# Altium footprint library JL_PCB.PCBLIB: 1129 footprints (part 44 of 72)
Each footprint in its own frame and in the unit in brackets; x right, y up, seen from the top. Pads: shape width x height; smd on the part's side, far side on the other; paste and mask are expansions set on the pad; w line width, h text height; cw(c..) or ccw(c..) is an arc to the next point about the centre after c.
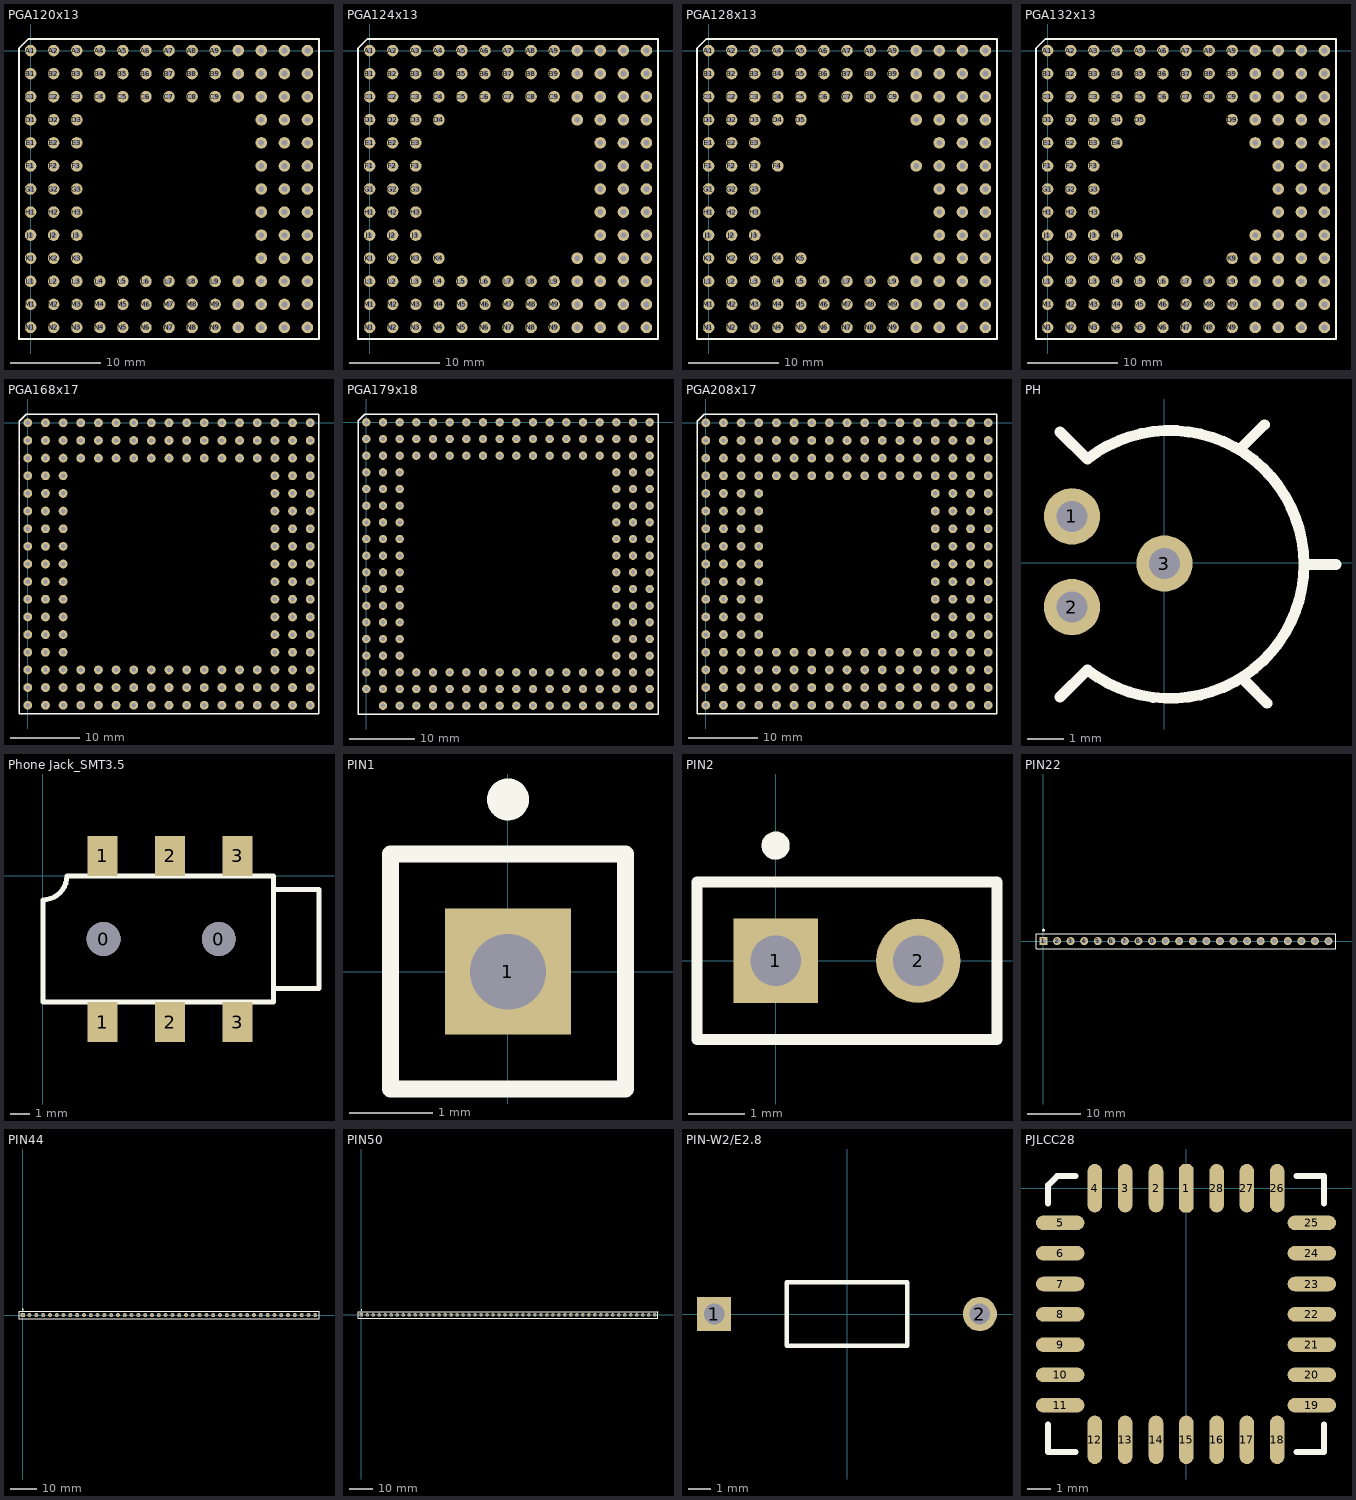
[diagram p43: the footprints below, top view; thin cyan lines are the x and y axes]

## PGA120x13 [mil]
pads (120):
  round 50 hole 25: A1(0,0) A2(100,0) A3(200,0) A4(300,0) A5(400,0) A6(500,0) A7(600,0) A8(700,0) A9(800,0) A10(900,0) A11(1000,0) A12(1100,0) A13(1200,0) B1(0,-100) B2(100,-100) B3(200,-100) B4(300,-100) B5(400,-100) B6(500,-100) B7(600,-100) B8(700,-100) B9(800,-100) B10(900,-100) B11(1000,-100) B12(1100,-100) B13(1200,-100) C1(0,-200) C2(100,-200) C3(200,-200) C4(300,-200) C5(400,-200) C6(500,-200) C7(600,-200) C8(700,-200) C9(800,-200) C10(900,-200) C11(1000,-200) C12(1100,-200) C13(1200,-200) D1(0,-300) D2(100,-300) D3(200,-300) D11(1000,-300) D12(1100,-300) D13(1200,-300) E1(0,-400) E2(100,-400) E3(200,-400) E11(1000,-400) E12(1100,-400) E13(1200,-400) F1(0,-500) F2(100,-500) F3(200,-500) F11(1000,-500) F12(1100,-500) F13(1200,-500) G1(0,-600) G2(100,-600) G3(200,-600) G11(1000,-600) G12(1100,-600) G13(1200,-600) H1(0,-700) H2(100,-700) H3(200,-700) H11(1000,-700) H12(1100,-700) H13(1200,-700) J1(0,-800) J2(100,-800) J3(200,-800) J11(1000,-800) J12(1100,-800) J13(1200,-800) K1(0,-900) K2(100,-900) K3(200,-900) K11(1000,-900) K12(1100,-900) K13(1200,-900) L1(0,-1000) L2(100,-1000) L3(200,-1000) L4(300,-1000) L5(400,-1000) L6(500,-1000) L7(600,-1000) L8(700,-1000) L9(800,-1000) L10(900,-1000) L11(1000,-1000) L12(1100,-1000) L13(1200,-1000) M1(0,-1100) M2(100,-1100) M3(200,-1100) M4(300,-1100) M5(400,-1100) M6(500,-1100) M7(600,-1100) M8(700,-1100) M9(800,-1100) M10(900,-1100) M11(1000,-1100) M12(1100,-1100) M13(1200,-1100) N1(0,-1200) N2(100,-1200) N3(200,-1200) N4(300,-1200) N5(400,-1200) N6(500,-1200) N7(600,-1200) N8(700,-1200) N9(800,-1200) N10(900,-1200) N11(1000,-1200) N12(1100,-1200) N13(1200,-1200)
TopOverlay:
  lines w8: -50,-1250 -50,10 -10,50 1250,50 1250,-1250 -50,-1250

## PGA124x13 [mil]
pads (124):
  round 50 hole 25: A1(0,0) A2(100,0) A3(200,0) A4(300,0) A5(400,0) A6(500,0) A7(600,0) A8(700,0) A9(800,0) A10(900,0) A11(1000,0) A12(1100,0) A13(1200,0) B1(0,-100) B2(100,-100) B3(200,-100) B4(300,-100) B5(400,-100) B6(500,-100) B7(600,-100) B8(700,-100) B9(800,-100) B10(900,-100) B11(1000,-100) B12(1100,-100) B13(1200,-100) C1(0,-200) C2(100,-200) C3(200,-200) C4(300,-200) C5(400,-200) C6(500,-200) C7(600,-200) C8(700,-200) C9(800,-200) C10(900,-200) C11(1000,-200) C12(1100,-200) C13(1200,-200) D1(0,-300) D2(100,-300) D3(200,-300) D4(300,-300) D10(900,-300) D11(1000,-300) D12(1100,-300) D13(1200,-300) E1(0,-400) E2(100,-400) E3(200,-400) E11(1000,-400) E12(1100,-400) E13(1200,-400) F1(0,-500) F2(100,-500) F3(200,-500) F11(1000,-500) F12(1100,-500) F13(1200,-500) G1(0,-600) G2(100,-600) G3(200,-600) G11(1000,-600) G12(1100,-600) G13(1200,-600) H1(0,-700) H2(100,-700) H3(200,-700) H11(1000,-700) H12(1100,-700) H13(1200,-700) J1(0,-800) J2(100,-800) J3(200,-800) J11(1000,-800) J12(1100,-800) J13(1200,-800) K1(0,-900) K2(100,-900) K3(200,-900) K4(300,-900) K10(900,-900) K11(1000,-900) K12(1100,-900) K13(1200,-900) L1(0,-1000) L2(100,-1000) L3(200,-1000) L4(300,-1000) L5(400,-1000) L6(500,-1000) L7(600,-1000) L8(700,-1000) L9(800,-1000) L10(900,-1000) L11(1000,-1000) L12(1100,-1000) L13(1200,-1000) M1(0,-1100) M2(100,-1100) M3(200,-1100) M4(300,-1100) M5(400,-1100) M6(500,-1100) M7(600,-1100) M8(700,-1100) M9(800,-1100) M10(900,-1100) M11(1000,-1100) M12(1100,-1100) M13(1200,-1100) N1(0,-1200) N2(100,-1200) N3(200,-1200) N4(300,-1200) N5(400,-1200) N6(500,-1200) N7(600,-1200) N8(700,-1200) N9(800,-1200) N10(900,-1200) N11(1000,-1200) N12(1100,-1200) N13(1200,-1200)
TopOverlay:
  lines w8: -50,-1250 -50,10 -10,50 1250,50 1250,-1250 -50,-1250

## PGA128x13 [mil]
pads (128):
  round 50 hole 25: A1(0,0) A2(100,0) A3(200,0) A4(300,0) A5(400,0) A6(500,0) A7(600,0) A8(700,0) A9(800,0) A10(900,0) A11(1000,0) A12(1100,0) A13(1200,0) B1(0,-100) B2(100,-100) B3(200,-100) B4(300,-100) B5(400,-100) B6(500,-100) B7(600,-100) B8(700,-100) B9(800,-100) B10(900,-100) B11(1000,-100) B12(1100,-100) B13(1200,-100) C1(0,-200) C2(100,-200) C3(200,-200) C4(300,-200) C5(400,-200) C6(500,-200) C7(600,-200) C8(700,-200) C9(800,-200) C10(900,-200) C11(1000,-200) C12(1100,-200) C13(1200,-200) D1(0,-300) D2(100,-300) D3(200,-300) D4(300,-300) D5(400,-300) D10(900,-300) D11(1000,-300) D12(1100,-300) D13(1200,-300) E1(0,-400) E2(100,-400) E3(200,-400) E11(1000,-400) E12(1100,-400) E13(1200,-400) F1(0,-500) F2(100,-500) F3(200,-500) F4(300,-500) F10(900,-500) F11(1000,-500) F12(1100,-500) F13(1200,-500) G1(0,-600) G2(100,-600) G3(200,-600) G11(1000,-600) G12(1100,-600) G13(1200,-600) H1(0,-700) H2(100,-700) H3(200,-700) H11(1000,-700) H12(1100,-700) H13(1200,-700) J1(0,-800) J2(100,-800) J3(200,-800) J11(1000,-800) J12(1100,-800) J13(1200,-800) K1(0,-900) K2(100,-900) K3(200,-900) K4(300,-900) K5(400,-900) K10(900,-900) K11(1000,-900) K12(1100,-900) K13(1200,-900) L1(0,-1000) L2(100,-1000) L3(200,-1000) L4(300,-1000) L5(400,-1000) L6(500,-1000) L7(600,-1000) L8(700,-1000) L9(800,-1000) L10(900,-1000) L11(1000,-1000) L12(1100,-1000) L13(1200,-1000) M1(0,-1100) M2(100,-1100) M3(200,-1100) M4(300,-1100) M5(400,-1100) M6(500,-1100) M7(600,-1100) M8(700,-1100) M9(800,-1100) M10(900,-1100) M11(1000,-1100) M12(1100,-1100) M13(1200,-1100) N1(0,-1200) N2(100,-1200) N3(200,-1200) N4(300,-1200) N5(400,-1200) N6(500,-1200) N7(600,-1200) N8(700,-1200) N9(800,-1200) N10(900,-1200) N11(1000,-1200) N12(1100,-1200) N13(1200,-1200)
TopOverlay:
  lines w8: -50,-1250 -50,10 -10,50 1250,50 1250,-1250 -50,-1250

## PGA132x13 [mil]
pads (132):
  round 50 hole 25: A1(0,0) A2(100,0) A3(200,0) A4(300,0) A5(400,0) A6(500,0) A7(600,0) A8(700,0) A9(800,0) A10(900,0) A11(1000,0) A12(1100,0) A13(1200,0) B1(0,-100) B2(100,-100) B3(200,-100) B4(300,-100) B5(400,-100) B6(500,-100) B7(600,-100) B8(700,-100) B9(800,-100) B10(900,-100) B11(1000,-100) B12(1100,-100) B13(1200,-100) C1(0,-200) C2(100,-200) C3(200,-200) C4(300,-200) C5(400,-200) C6(500,-200) C7(600,-200) C8(700,-200) C9(800,-200) C10(900,-200) C11(1000,-200) C12(1100,-200) C13(1200,-200) D1(0,-300) D2(100,-300) D3(200,-300) D4(300,-300) D5(400,-300) D9(800,-300) D10(900,-300) D11(1000,-300) D12(1100,-300) D13(1200,-300) E1(0,-400) E2(100,-400) E3(200,-400) E4(300,-400) E10(900,-400) E11(1000,-400) E12(1100,-400) E13(1200,-400) F1(0,-500) F2(100,-500) F3(200,-500) F11(1000,-500) F12(1100,-500) F13(1200,-500) G1(0,-600) G2(100,-600) G3(200,-600) G11(1000,-600) G12(1100,-600) G13(1200,-600) H1(0,-700) H2(100,-700) H3(200,-700) H11(1000,-700) H12(1100,-700) H13(1200,-700) J1(0,-800) J2(100,-800) J3(200,-800) J4(300,-800) J10(900,-800) J11(1000,-800) J12(1100,-800) J13(1200,-800) K1(0,-900) K2(100,-900) K3(200,-900) K4(300,-900) K5(400,-900) K9(800,-900) K10(900,-900) K11(1000,-900) K12(1100,-900) K13(1200,-900) L1(0,-1000) L2(100,-1000) L3(200,-1000) L4(300,-1000) L5(400,-1000) L6(500,-1000) L7(600,-1000) L8(700,-1000) L9(800,-1000) L10(900,-1000) L11(1000,-1000) L12(1100,-1000) L13(1200,-1000) M1(0,-1100) M2(100,-1100) M3(200,-1100) M4(300,-1100) M5(400,-1100) M6(500,-1100) M7(600,-1100) M8(700,-1100) M9(800,-1100) M10(900,-1100) M11(1000,-1100) M12(1100,-1100) M13(1200,-1100) N1(0,-1200) N2(100,-1200) N3(200,-1200) N4(300,-1200) N5(400,-1200) N6(500,-1200) N7(600,-1200) N8(700,-1200) N9(800,-1200) N10(900,-1200) N11(1000,-1200) N12(1100,-1200) N13(1200,-1200)
TopOverlay:
  lines w8: -50,-1250 -50,10 -10,50 1250,50 1250,-1250 -50,-1250

## PGA168x17 [mil]
pads (168):
  round 50 hole 25: A1(0,0) A2(100,0) A3(200,0) A4(300,0) A5(400,0) A6(500,0) A7(600,0) A8(700,0) A9(800,0) A10(900,0) A11(1000,0) A12(1100,0) A13(1200,0) A14(1300,0) A15(1400,0) A16(1500,0) A17(1600,0) B1(0,-100) B2(100,-100) B3(200,-100) B4(300,-100) B5(400,-100) B6(500,-100) B7(600,-100) B8(700,-100) B9(800,-100) B10(900,-100) B11(1000,-100) B12(1100,-100) B13(1200,-100) B14(1300,-100) B15(1400,-100) B16(1500,-100) B17(1600,-100) C1(0,-200) C2(100,-200) C3(200,-200) C4(300,-200) C5(400,-200) C6(500,-200) C7(600,-200) C8(700,-200) C9(800,-200) C10(900,-200) C11(1000,-200) C12(1100,-200) C13(1200,-200) C14(1300,-200) C15(1400,-200) C16(1500,-200) C17(1600,-200) D1(0,-300) D2(100,-300) D3(200,-300) D15(1400,-300) D16(1500,-300) D17(1600,-300) E1(0,-400) E2(100,-400) E3(200,-400) E15(1400,-400) E16(1500,-400) E17(1600,-400) F1(0,-500) F2(100,-500) F3(200,-500) F15(1400,-500) F16(1500,-500) F17(1600,-500) G1(0,-600) G2(100,-600) G3(200,-600) G15(1400,-600) G16(1500,-600) G17(1600,-600) H1(0,-700) H2(100,-700) H3(200,-700) H15(1400,-700) H16(1500,-700) H17(1600,-700) J1(0,-800) J2(100,-800) J3(200,-800) J15(1400,-800) J16(1500,-800) J17(1600,-800) K1(0,-900) K2(100,-900) K3(200,-900) K15(1400,-900) K16(1500,-900) K17(1600,-900) L1(0,-1000) L2(100,-1000) L3(200,-1000) L15(1400,-1000) L16(1500,-1000) L17(1600,-1000) M1(0,-1100) M2(100,-1100) M3(200,-1100) M15(1400,-1100) M16(1500,-1100) M17(1600,-1100) N1(0,-1200) N2(100,-1200) N3(200,-1200) N15(1400,-1200) N16(1500,-1200) N17(1600,-1200) P1(0,-1300) P2(100,-1300) P3(200,-1300) P15(1400,-1300) P16(1500,-1300) P17(1600,-1300) Q1(0,-1400) Q2(100,-1400) Q3(200,-1400) Q4(300,-1400) Q5(400,-1400) Q6(500,-1400) Q7(600,-1400) Q8(700,-1400) Q9(800,-1400) Q10(900,-1400) Q11(1000,-1400) Q12(1100,-1400) Q13(1200,-1400) Q14(1300,-1400) Q15(1400,-1400) Q16(1500,-1400) Q17(1600,-1400) R1(0,-1500) R2(100,-1500) R3(200,-1500) R4(300,-1500) R5(400,-1500) R6(500,-1500) R7(600,-1500) R8(700,-1500) R9(800,-1500) R10(900,-1500) R11(1000,-1500) R12(1100,-1500) R13(1200,-1500) R14(1300,-1500) R15(1400,-1500) R16(1500,-1500) R17(1600,-1500) S1(0,-1600) S2(100,-1600) S3(200,-1600) S4(300,-1600) S5(400,-1600) S6(500,-1600) S7(600,-1600) S8(700,-1600) S9(800,-1600) S10(900,-1600) S11(1000,-1600) S12(1100,-1600) S13(1200,-1600) S14(1300,-1600) S15(1400,-1600) S16(1500,-1600) S17(1600,-1600)
TopOverlay:
  lines w8: -50,-1650 -50,10 -10,50 1650,50 1650,-1650 -50,-1650

## PGA179x18 [mil]
pads (179):
  round 50 hole 25: A1(0,0) A2(100,0) A3(200,0) A4(300,0) A5(400,0) A6(500,0) A7(600,0) A8(700,0) A9(800,0) A10(900,0) A11(1000,0) A12(1100,0) A13(1200,0) A14(1300,0) A15(1400,0) A16(1500,0) A17(1600,0) A18(1700,0) B1(0,-100) B2(100,-100) B3(200,-100) B4(300,-100) B5(400,-100) B6(500,-100) B7(600,-100) B8(700,-100) B9(800,-100) B10(900,-100) B11(1000,-100) B12(1100,-100) B13(1200,-100) B14(1300,-100) B15(1400,-100) B16(1500,-100) B17(1600,-100) B18(1700,-100) C1(0,-200) C2(100,-200) C3(200,-200) C4(300,-200) C5(400,-200) C6(500,-200) C7(600,-200) C8(700,-200) C9(800,-200) C10(900,-200) C11(1000,-200) C12(1100,-200) C13(1200,-200) C14(1300,-200) C15(1400,-200) C16(1500,-200) C17(1600,-200) C18(1700,-200) D1(0,-300) D2(100,-300) D3(200,-300) D16(1500,-300) D17(1600,-300) D18(1700,-300) E1(0,-400) E2(100,-400) E3(200,-400) E16(1500,-400) E17(1600,-400) E18(1700,-400) F1(0,-500) F2(100,-500) F3(200,-500) F16(1500,-500) F17(1600,-500) F18(1700,-500) G1(0,-600) G2(100,-600) G3(200,-600) G16(1500,-600) G17(1600,-600) G18(1700,-600) H1(0,-700) H2(100,-700) H3(200,-700) H16(1500,-700) H17(1600,-700) H18(1700,-700) J1(0,-800) J2(100,-800) J3(200,-800) J16(1500,-800) J17(1600,-800) J18(1700,-800) K1(0,-900) K2(100,-900) K3(200,-900) K16(1500,-900) K17(1600,-900) K18(1700,-900) L1(0,-1000) L2(100,-1000) L3(200,-1000) L16(1500,-1000) L17(1600,-1000) L18(1700,-1000) M1(0,-1100) M2(100,-1100) M3(200,-1100) M16(1500,-1100) M17(1600,-1100) M18(1700,-1100) N1(0,-1200) N2(100,-1200) N3(200,-1200) N16(1500,-1200) N17(1600,-1200) N18(1700,-1200) P1(0,-1300) P2(100,-1300) P3(200,-1300) P16(1500,-1300) P17(1600,-1300) P18(1700,-1300) Q1(0,-1400) Q2(100,-1400) Q3(200,-1400) Q16(1500,-1400) Q17(1600,-1400) Q18(1700,-1400) R1(0,-1500) R2(100,-1500) R3(200,-1500) R4(300,-1500) R5(400,-1500) R6(500,-1500) R7(600,-1500) R8(700,-1500) R9(800,-1500) R10(900,-1500) R11(1000,-1500) R12(1100,-1500) R13(1200,-1500) R14(1300,-1500) R15(1400,-1500) R16(1500,-1500) R17(1600,-1500) R18(1700,-1500) S1(0,-1600) S2(100,-1600) S3(200,-1600) S4(300,-1600) S5(400,-1600) S6(500,-1600) S7(600,-1600) S8(700,-1600) S9(800,-1600) S10(900,-1600) S11(1000,-1600) S12(1100,-1600) S13(1200,-1600) S14(1300,-1600) S15(1400,-1600) S16(1500,-1600) S17(1600,-1600) S18(1700,-1600) T2(100,-1700) T3(200,-1700) T4(300,-1700) T5(400,-1700) T6(500,-1700) T7(600,-1700) T8(700,-1700) T9(800,-1700) T10(900,-1700) T11(1000,-1700) T12(1100,-1700) T13(1200,-1700) T14(1300,-1700) T15(1400,-1700) T16(1500,-1700) T17(1600,-1700) T18(1700,-1700)
TopOverlay:
  lines w8: -50,-1750 1750,-1750 1750,50 -10,50 -50,10 -50,-1750

## PGA208x17 [mil]
pads (208):
  round 50 hole 25: A1(0,0) A2(100,0) A3(200,0) A4(300,0) A5(400,0) A6(500,0) A7(600,0) A8(700,0) A9(800,0) A10(900,0) A11(1000,0) A12(1100,0) A13(1200,0) A14(1300,0) A15(1400,0) A16(1500,0) A17(1600,0) B1(0,-100) B2(100,-100) B3(200,-100) B4(300,-100) B5(400,-100) B6(500,-100) B7(600,-100) B8(700,-100) B9(800,-100) B10(900,-100) B11(1000,-100) B12(1100,-100) B13(1200,-100) B14(1300,-100) B15(1400,-100) B16(1500,-100) B17(1600,-100) C1(0,-200) C2(100,-200) C3(200,-200) C4(300,-200) C5(400,-200) C6(500,-200) C7(600,-200) C8(700,-200) C9(800,-200) C10(900,-200) C11(1000,-200) C12(1100,-200) C13(1200,-200) C14(1300,-200) C15(1400,-200) C16(1500,-200) C17(1600,-200) D1(0,-300) D2(100,-300) D3(200,-300) D4(300,-300) D5(400,-300) D6(500,-300) D7(600,-300) D8(700,-300) D9(800,-300) D10(900,-300) D11(1000,-300) D12(1100,-300) D13(1200,-300) D14(1300,-300) D15(1400,-300) D16(1500,-300) D17(1600,-300) E1(0,-400) E2(100,-400) E3(200,-400) E4(300,-400) E14(1300,-400) E15(1400,-400) E16(1500,-400) E17(1600,-400) F1(0,-500) F2(100,-500) F3(200,-500) F4(300,-500) F14(1300,-500) F15(1400,-500) F16(1500,-500) F17(1600,-500) G1(0,-600) G2(100,-600) G3(200,-600) G4(300,-600) G14(1300,-600) G15(1400,-600) G16(1500,-600) G17(1600,-600) H1(0,-700) H2(100,-700) H3(200,-700) H4(300,-700) H14(1300,-700) H15(1400,-700) H16(1500,-700) H17(1600,-700) J1(0,-800) J2(100,-800) J3(200,-800) J4(300,-800) J14(1300,-800) J15(1400,-800) J16(1500,-800) J17(1600,-800) K1(0,-900) K2(100,-900) K3(200,-900) K4(300,-900) K14(1300,-900) K15(1400,-900) K16(1500,-900) K17(1600,-900) L1(0,-1000) L2(100,-1000) L3(200,-1000) L4(300,-1000) L14(1300,-1000) L15(1400,-1000) L16(1500,-1000) L17(1600,-1000) M1(0,-1100) M2(100,-1100) M3(200,-1100) M4(300,-1100) M14(1300,-1100) M15(1400,-1100) M16(1500,-1100) M17(1600,-1100) N1(0,-1200) N2(100,-1200) N3(200,-1200) N4(300,-1200) N14(1300,-1200) N15(1400,-1200) N16(1500,-1200) N17(1600,-1200) P1(0,-1300) P2(100,-1300) P3(200,-1300) P4(300,-1300) P5(400,-1300) P6(500,-1300) P7(600,-1300) P8(700,-1300) P9(800,-1300) P10(900,-1300) P11(1000,-1300) P12(1100,-1300) P13(1200,-1300) P14(1300,-1300) P15(1400,-1300) P16(1500,-1300) P17(1600,-1300) Q1(0,-1400) Q2(100,-1400) Q3(200,-1400) Q4(300,-1400) Q5(400,-1400) Q6(500,-1400) Q7(600,-1400) Q8(700,-1400) Q9(800,-1400) Q10(900,-1400) Q11(1000,-1400) Q12(1100,-1400) Q13(1200,-1400) Q14(1300,-1400) Q15(1400,-1400) Q16(1500,-1400) Q17(1600,-1400) R1(0,-1500) R2(100,-1500) R3(200,-1500) R4(300,-1500) R5(400,-1500) R6(500,-1500) R7(600,-1500) R8(700,-1500) R9(800,-1500) R10(900,-1500) R11(1000,-1500) R12(1100,-1500) R13(1200,-1500) R14(1300,-1500) R15(1400,-1500) R16(1500,-1500) R17(1600,-1500) S1(0,-1600) S2(100,-1600) S3(200,-1600) S4(300,-1600) S5(400,-1600) S6(500,-1600) S7(600,-1600) S8(700,-1600) S9(800,-1600) S10(900,-1600) S11(1000,-1600) S12(1100,-1600) S13(1200,-1600) S14(1300,-1600) S15(1400,-1600) S16(1500,-1600) S17(1600,-1600)
TopOverlay:
  lines w8: -50,-1650 1650,-1650 1650,50 -10,50 -50,10 -50,-1650

## PH [mm]
pads (3):
  round 1.55 hole 0.85: 1(-2.55,1.275) 2(-2.55,-1.225) 3(0,-0.025)
TopOverlay:
  lines w0.3: -2.875,-3.7 -2.125,-2.95 ; -2.875,3.6 -2.125,2.85 ; -2.122,-2.958 ccw(c0.15,-0.05) -2.122,2.858 ; 2.1,3.15 2.75,3.8 ; 2.2,-3.25 2.825,-3.875 ; 3.875,-0.05 4.725,-0.05

## Phone Jack_SMT3.5 [mm]
pads (8):
  round 1.7 hole 1.7: 0(3.05,-3.18) 0(8.85,-3.18)
  rect 1.5x2 smd: 1(3,-7.36) 1(3,1) 2(6.4,-7.36) 2(6.4,1) 3(9.8,-7.36) 3(9.8,1)
TopOverlay:
  lines w0.254: 11.6,-5.68 13.9,-5.68 13.9,-0.68 11.6,-0.68 ; 0,-6.36 11.6,-6.36 11.6,0 1.207,0 cw(c0,0) 0,-1.207 0,-6.36
3D body "Phone Jack SMT_3.5.STEP": height 4.95, standoff -0.7, extent 0.01,-7.731 13.91,1.219

## PIN1 [mm] "Connector; Plug"
pads (1):
  rect 1.5x1.5 hole 0.9: 1(0,0)
TopOverlay:
  circle w0.25: c0,2.05 r0.125
  lines w0.2: -1.4,-1.4 1.4,-1.4 1.4,1.4 -1.4,1.4 -1.4,-1.4

## PIN2 [mm] "Photosensitive Diode; 2 Leads"
pads (2):
  rect 1.5x1.5 hole 0.9: 1(0,0)
  round 1.5 hole 0.9: 2(2.54,0)
TopOverlay:
  circle w0.25: c0,2.05 r0.125
  lines w0.2: -1.4,-1.4 3.94,-1.4 3.94,1.4 -1.4,1.4 -1.4,-1.4

## PIN22 [mm] "Connector; Edge; 22 Position"
pads (22):
  rect 1.5x1.5 hole 0.9: 1(0,0)
  round 1.5 hole 0.9: 2(2.54,0) 3(5.08,0) 4(7.62,0) 5(10.16,0) 6(12.7,0) 7(15.24,0) 8(17.78,0) 10(22.86,0) 11(25.4,0) 12(27.94,0) 13(30.48,0) 14(33.02,0) 15(35.56,0) 16(38.1,0) 17(40.64,0) 18(43.18,0) 19(45.72,0) 20(48.26,0) 21(50.8,0) 22(53.34,0)
  oval 1.51x1.5 hole 0.9: 9(20.32,0)
TopOverlay:
  circle w0.25: c0,2.05 r0.125
  lines w0.2: -1.4,-1.4 54.74,-1.4 54.74,1.4 -1.4,1.4 -1.4,-1.4

## PIN44 [mm] "Connector; Edge; 44 Position"
pads (44):
  rect 1.5x1.5 hole 0.9: 1(0,0)
  round 1.5 hole 0.9: 2(2.54,0) 3(5.08,0) 4(7.62,0) 5(10.16,0) 6(12.7,0) 7(15.24,0) 8(17.78,0) 10(22.86,0) 11(25.4,0) 12(27.94,0) 13(30.48,0) 14(33.02,0) 15(35.56,0) 16(38.1,0) 17(40.64,0) 18(43.18,0) 19(45.72,0) 20(48.26,0) 21(50.8,0) 22(53.34,0) 23(55.88,0) 24(58.42,0) 25(60.96,0) 26(63.5,0) 27(66.04,0) 28(68.58,0) 29(71.12,0) 30(73.66,0) 31(76.2,0) 32(78.74,0) 33(81.28,0) 34(83.82,0) 35(86.36,0) 36(88.9,0) 37(91.44,0) 38(93.98,0) 39(96.52,0) 40(99.06,0) 41(101.6,0) 42(104.14,0) 43(106.68,0) 44(109.22,0)
  oval 1.51x1.5 hole 0.9: 9(20.32,0)
TopOverlay:
  circle w0.25: c0,2.05 r0.125
  lines w0.2: -1.4,-1.4 -1.4,1.4 110.62,1.4 110.62,-1.4 -1.4,-1.4

## PIN50 [mm] "Connector; Edge; 50 Position"
pads (50):
  rect 1.5x1.5 hole 0.9: 1(0,0)
  round 1.5 hole 0.9: 2(2.54,0) 3(5.08,0) 4(7.62,0) 5(10.16,0) 6(12.7,0) 7(15.24,0) 8(17.78,0) 9(20.32,0) 10(22.86,0) 11(25.4,0) 12(27.94,0) 13(30.48,0) 14(33.02,0) 15(35.56,0) 16(38.1,0) 17(40.64,0) 18(43.18,0) 19(45.72,0) 20(48.26,0) 22(53.34,0) 23(55.88,0) 24(58.42,0) 25(60.96,0) 26(63.5,0) 27(66.04,0) 28(68.58,0) 29(71.12,0) 30(73.66,0) 31(76.2,0) 32(78.74,0) 33(81.28,0) 34(83.82,0) 35(86.36,0) 36(88.9,0) 37(91.44,0) 38(93.98,0) 39(96.52,0) 40(99.06,0) 41(101.6,0) 42(104.14,0) 43(106.68,0) 44(109.22,0) 45(111.76,0) 46(114.3,0) 47(116.84,0) 48(119.38,0) 49(121.92,0) 50(124.46,0)
  oval 1.51x1.5 hole 0.9: 21(50.8,0)
TopOverlay:
  circle w0.25: c0,2.05 r0.125
  lines w0.2: -1.4,-1.4 125.86,-1.4 125.86,1.4 -1.4,1.4 -1.4,-1.4

## PIN-W2/E2.8 [mm] "Fuse; 2 Leads"
pads (2):
  rect 1.5x1.5 hole 0.9: 1(-5.825,0)
  round 1.5 hole 0.9: 2(5.825,0)
TopOverlay:
  lines w0.2: -2.65,-1.4 -2.65,1.4 2.65,1.4 2.65,-1.4 -2.65,-1.4

## PJLCC28 [mil]
pads (28):
  oct 24x80 smd: 1(0,0)
  oval 24x80 smd: 2(-50,0) 3(-101,0) 4(-151,0) 12(-151,-415) 13(-101,-415) 14(-50,-415) 15(0,-415) 16(50,-415) 17(100,-415) 18(150,-415) 26(150,0) 27(100,0) 28(50,0)
  oval 80x24 smd: 5(-208,-57) 6(-208,-107) 7(-208,-158) 8(-208,-208) 9(-208,-258) 10(-208,-308) 11(-208,-358) 19(207,-358) 20(207,-308) 21(207,-258) 22(207,-208) 23(207,-158) 24(207,-107) 25(207,-57)
TopOverlay:
  lines w10: -228,-390 -228,-435 -183,-435 ; -228,-25 -228,5 -213,20 -183,20 ; 182,-435 227,-435 227,-390 ; 182,20 227,20 227,-25